# Altium footprint library En.PcbLib: 240 footprints (part 4 of 15)
Each footprint in its own frame and in the unit in brackets; x right, y up, seen from the top. Pads: shape width x height; smd on the part's side, far side on the other; paste and mask are expansions set on the pad; w line width, h text height; cw(c..) or ccw(c..) is an arc to the next point about the centre after c.
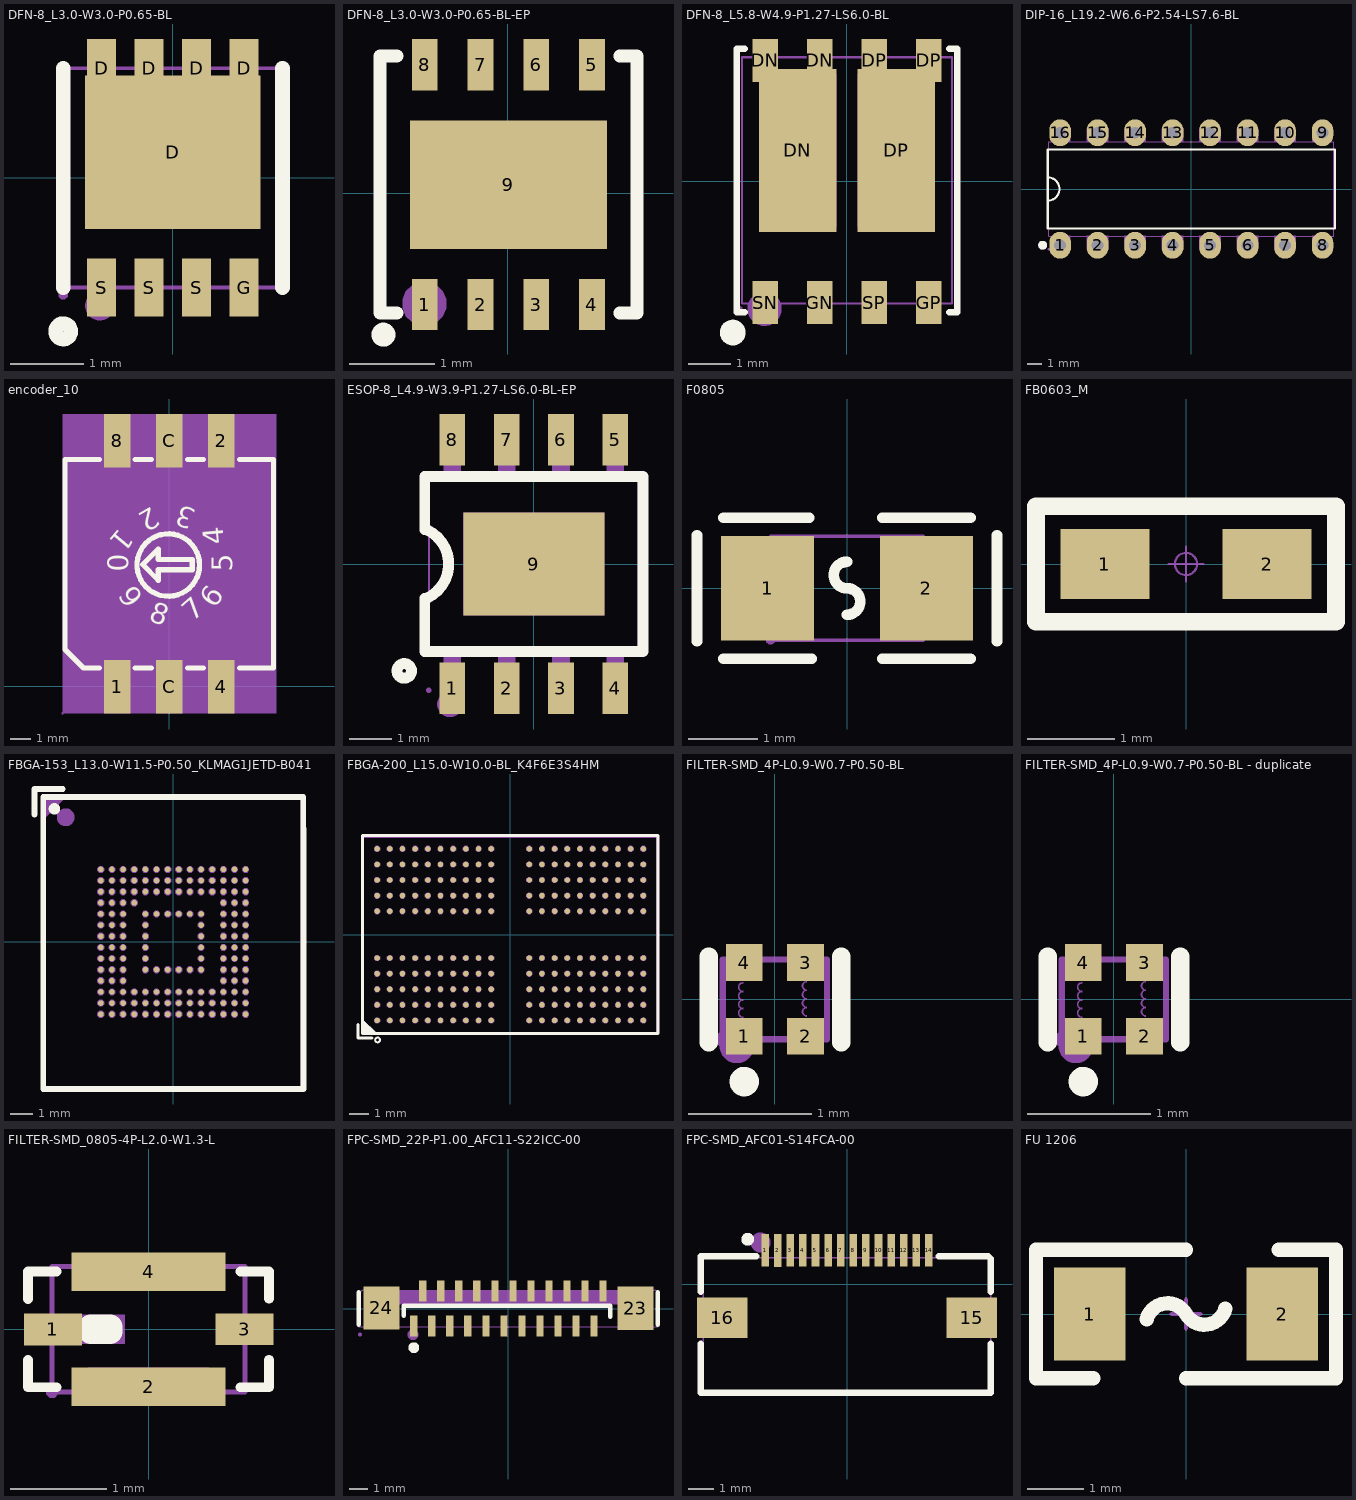
[diagram p3: the footprints below, top view; thin cyan lines are the x and y axes]

## DFN-8_L3.0-W3.0-P0.65-BL [mm]
pads (9):
  rect 0.4x0.8 smd paste-100 mask+0.051: D(-0.975,1.5) D(-0.325,1.5) D(0.325,1.5) D(0.975,1.5) G(0.975,-1.5) S(-0.975,-1.5) S(-0.325,-1.5) S(0.325,-1.5)
  rect 2.4x2.1 smd paste-100 mask+0.051: D(0,0.35)
Top Overlay:
  circle w0.2: c-1.5,-2.1 r0.105
  lines w0.2: -1.5,-1.5 -1.5,1.5 ; 1.5,-1.5 1.5,1.5
Top Paste:
  region: -0.775,-1.9 -1.175,-1.9 -1.175,-1.1 -0.775,-1.1
  region: -0.125,-1.9 -0.525,-1.9 -0.525,-1.1 -0.125,-1.1
  region: 0.525,-1.9 0.125,-1.9 0.125,-1.1 0.525,-1.1
  region: 1.175,-1.9 0.775,-1.9 0.775,-1.1 1.175,-1.1
  region: 1.2,-0.7 -1.2,-0.7 -1.2,1.4 -1.175,1.4 -1.175,1.9 -0.775,1.9 -0.775,1.4 -0.525,1.4 -0.525,1.9 -0.125,1.9 -0.125,1.4 0.125,1.4 0.125,1.9 0.525,1.9 0.525,1.4 0.775,1.4 0.775,1.9 1.175,1.9 1.175,1.4 1.2,1.4
Mechanical 6:
  circle w0.2: c-1,-1.75 r0.1
Mechanical 15:
  region: -1.44,-1.6 -1.44,-1.576 -1.475,-1.541 -1.524,-1.541 -1.559,-1.576 -1.56,-1.6 -1.559,-1.625 -1.524,-1.659 -1.475,-1.659 -1.44,-1.625
  region: 1.125,1.2 0.825,1.2 0.825,1.6 1.125,1.6
  region: 1.125,-1.6 0.825,-1.6 0.825,-1.2 1.125,-1.2
  region: -1.175,1.35 1.175,1.35 1.175,-0.65 -1.175,-0.65
  region: 0.475,-1.6 0.175,-1.6 0.175,-1.2 0.475,-1.2
  region: -0.175,-1.6 -0.475,-1.6 -0.475,-1.2 -0.175,-1.2
  region: -0.825,-1.6 -1.125,-1.6 -1.125,-1.2 -0.825,-1.2
  region: 0.475,1.2 0.175,1.2 0.175,1.6 0.475,1.6
  region: -0.175,1.2 -0.475,1.2 -0.475,1.6 -0.175,1.6
  region: -0.825,1.2 -1.125,1.2 -1.125,1.6 -0.825,1.6
  lines w0.051: -1.5,-1.5 -1.5,1.5 1.5,1.5 1.5,-1.5 -1.5,-1.5
3D body "User Library-DFN_3x3_8L_EP2_P_body.sldprt": height 0.8, standoff 0, extent -1.5,-1.5 1.5,1.5
3D body "User Library-DFN_3x3_8L_EP2_P_lead frame.sldprt": height 0.15, standoff 0, extent -1.55,-1.6 1.55,1.6

## DFN-8_L3.0-W3.0-P0.65-BL-EP [mm]
pads (9):
  rect 0.3x0.6 smd paste+0 mask+0.05: 1(-0.966,-1.297) 2(-0.316,-1.297) 3(0.334,-1.297) 4(0.984,-1.297) 5(0.984,1.503) 6(0.334,1.503) 7(-0.316,1.503) 8(-0.966,1.503)
  rect 2.3x1.5 smd paste+0 mask+0.05: 9(0.009,0.103)
Top Overlay:
  circle w0.178: c-1.449,-1.648 r0.051
  lines w0.15: -1.291,-1.397 -1.491,-1.397 -1.491,1.603 -1.291,1.603 ; 1.309,-1.397 1.509,-1.397 1.509,1.603 1.309,1.603
Mechanical 15:
  region: -1.225,-1.287 -1.225,-1.236 -1.186,-1.143 -1.114,-1.071 -1.021,-1.033 -0.92,-1.033 -0.827,-1.071 -0.755,-1.143 -0.717,-1.236 -0.717,-1.287 -0.717,-1.337 -0.755,-1.431 -0.827,-1.502 -0.92,-1.541 -1.021,-1.541 -1.114,-1.502 -1.186,-1.431 -1.225,-1.337 -1.225,-1.287

## DFN-8_L5.8-W4.9-P1.27-LS6.0-BL [mm]
pads (10):
  rect 0.6x1 smd paste-100 mask+0.05: DN(-1.905,2.825) DN(-0.635,2.825) DP(0.635,2.825) DP(1.905,2.825) GN(-0.635,-2.825) GP(1.905,-2.825) SN(-1.905,-2.825) SP(0.635,-2.825)
  rect 1.8x3.8 smd paste-100 mask+0.05: DN(-1.15,0.725) DP(1.15,0.725)
Top Overlay:
  circle w0.3: c-2.667,-3.526 r0.15
  lines w0.152: -2.382,-3.051 -2.576,-3.051 -2.576,3.101 -2.382,3.101 ; 2.382,-3.051 2.576,-3.051 2.576,3.101 2.382,3.101
Top Paste:
  region: 1.605,2.625 1.605,3.325 2.205,3.325 2.205,2.325 2.05,2.325 2.05,-1.174 2.05,-1.175 0.25,-1.175 0.25,2.625 0.335,2.625 0.335,3.325 0.935,3.325 0.935,2.625
  region: -1.605,2.625 -1.605,3.325 -2.205,3.325 -2.205,2.325 -2.05,2.325 -2.05,-1.174 -2.05,-1.175 -0.25,-1.175 -0.25,2.625 -0.335,2.625 -0.335,3.325 -0.935,3.325 -0.935,2.625
  region: 1.605,-3.325 2.205,-3.325 2.205,-2.325 1.605,-2.325
  region: 0.335,-3.325 0.935,-3.325 0.935,-2.325 0.335,-2.325
  region: -0.935,-3.325 -0.335,-3.325 -0.335,-2.325 -0.935,-2.325
  region: -2.205,-3.325 -1.605,-3.325 -1.605,-2.325 -2.205,-2.325
Mechanical 6:
  circle w0.4: c-1.924,-2.971 r0.2
Mechanical 15:
  region: -2.44,-2.975 -2.44,-2.951 -2.475,-2.916 -2.524,-2.916 -2.559,-2.951 -2.56,-2.975 -2.559,-3 -2.524,-3.034 -2.475,-3.034 -2.44,-3
  region: -2.11,-2.365 -1.7,-2.365 -1.7,-2.975 -2.11,-2.975
  region: -0.84,-2.365 -0.43,-2.365 -0.43,-2.975 -0.84,-2.975
  region: 0.43,-2.365 0.84,-2.365 0.84,-2.975 0.43,-2.975
  region: 1.7,-2.365 2.11,-2.365 2.11,-2.975 1.7,-2.975
  region: 0.25,2.515 1.9,2.515 1.9,-1.065 0.25,-1.065
  region: -1.9,2.515 -0.25,2.515 -0.25,-1.065 -1.9,-1.065
  region: -1.7,2.415 -2.11,2.415 -2.11,3.025 -1.7,3.025
  region: -0.43,2.415 -0.84,2.415 -0.84,3.025 -0.43,3.025
  region: 0.84,2.415 0.43,2.415 0.43,3.025 0.84,3.025
  region: 2.11,2.415 1.7,2.415 1.7,3.025 2.11,3.025
  lines w0.051: -2.45,-2.85 -2.45,2.9 2.45,2.9 2.45,-2.85 -2.45,-2.85
3D body "hn2199.step": height 1.01, standoff -0.01, extent -2.46,-3 2.46,3

## DIP-16_L19.2-W6.6-P2.54-LS7.6-BL [mm]
pads (16):
  oval 1.46x1.825 hole 0.8: 1(-8.89,-3.81) 2(-6.35,-3.81) 3(-3.81,-3.81) 4(-1.27,-3.81) 5(1.27,-3.81) 6(3.81,-3.81) 7(6.35,-3.81) 8(8.89,-3.81) 9(8.89,3.81) 10(6.35,3.81) 11(3.81,3.81) 12(1.27,3.81) 13(-1.27,3.81) 14(-3.81,3.81) 15(-6.35,3.81) 16(-8.89,3.81)
Top Overlay:
  circle w0.3: c-10.072,-3.81 r0.15
  lines w0.152: -9.729,-0.794 ccw(c-9.729,0) -9.729,0.794 ; -9.729,-2.669 9.729,-2.669 9.729,2.669 -9.729,2.669 -9.729,-2.669
Mechanical 6:
  circle w0.3: c-10.072,-3.81 r0.15
Mechanical 15:
  drawing of 37 lines, arcs and shapes, not listed
3D body "xd74ls147.step": height 3.31, standoff -4.05, extent -9.6,-3.833 9.6,4.087

## encoder_10 [mm]
pads (6):
  rect 1.3x2.6 smd: 1(-2.54,-0.025) 2(2.54,11.975) 4(2.54,-0.025) 8(-2.54,11.975) C(0,-0.025) C(0,11.975)
Top Overlay:
  circle w0.254: c-0.05,5.909 r1.524
  lines w0.254: -3.421,0.895 -4.191,0.895 -5.08,1.784 -5.08,11.055 -3.421,11.055 ; -1.659,0.895 -0.881,0.895 ; -1.659,11.055 -0.881,11.055 ; 0.881,0.895 1.659,0.895 ; 0.881,11.055 1.659,11.055 ; 3.421,0.895 5.08,0.895 5.08,11.055 3.421,11.055 ; -1.299,5.931 -0.537,5.169 -0.537,5.296 -0.537,5.677 1.114,5.677 1.114,6.185 -0.537,6.185 -0.537,6.693 -1.299,5.931
  text "0" at -2.008,5.576 h1
  text "4" at 2.674,6.955 h1
  text "8" at -1.044,3.21 h1
  text "9" at -2.545,4.438 h1
  text "1" at -2.418,7.761 h1
  text "2" at -0.865,8.786 h1
  text "3" at 1.365,8.558 h1
  text "5" at 3.072,5.576 h1
  text "6" at 2.207,3.75 h1
  text "7" at 1.133,3.118 h1
Mechanical 4:
  region: -5.207,13.275 5.207,13.275 5.207,-1.325 -5.207,-1.325
Mechanical 5:
  region: -3.19,10.675 -3.19,13.275 -1.89,13.275 -1.89,10.675
  region: -0.65,10.675 -0.65,13.275 0.65,13.275 0.65,10.675
  region: 1.89,10.675 1.89,13.275 3.19,13.275 3.19,10.675
  region: 1.89,-1.325 1.89,1.275 3.19,1.275 3.19,-1.325
  region: -0.65,-1.325 -0.65,1.275 0.65,1.275 0.65,-1.325
  region: -3.19,-1.325 -3.19,1.275 -1.89,1.275 -1.89,-1.325
Mechanical 6:
  circle w0.06: c-5.207,-1.325 r0.03
Mechanical 15:
  lines w0.003: -0.04,6.38 0.01,6.431

## ESOP-8_L4.9-W3.9-P1.27-LS6.0-BL-EP [mm]
pads (9):
  rect 0.6x1.2 smd: 1(-1.905,-2.908) 2(-0.635,-2.908) 3(0.635,-2.908) 4(1.905,-2.908) 5(1.905,2.908) 6(0.635,2.908) 7(-0.635,2.908) 8(-1.905,2.908)
  rect 3.3x2.4 smd: 9(0,0)
Top Overlay:
  circle w0.254: c-3.03,-2.5 r0.17
  lines w0.254: -2.55,-0.8 -2.55,-2.05 2.55,-2.05 2.55,2.05 -2.55,2.05 -2.55,0.8 ; -2.5,-0.8 ccw(c-2.875,0) -2.5,0.8
Mechanical 6:
  circle w0.3: c-1.96,-3.28 r0.15
Mechanical 15:
  region: 1.65,-1.2 -1.65,-1.2 -1.65,1.2 1.65,1.2
  region: 1.705,-2.95 1.705,-2.3 2.105,-2.3 2.105,-2.95
  region: 1.705,-2.31 1.705,-1.94 2.105,-1.94 2.105,-2.31
  region: 0.435,-2.95 0.435,-2.3 0.835,-2.3 0.835,-2.95
  region: 0.435,-2.31 0.435,-1.94 0.835,-1.94 0.835,-2.31
  region: -0.835,-2.95 -0.835,-2.3 -0.435,-2.3 -0.435,-2.95
  region: -0.835,-2.31 -0.835,-1.94 -0.435,-1.94 -0.435,-2.31
  region: -2.105,-2.95 -2.105,-2.3 -1.705,-2.3 -1.705,-2.95
  region: -2.105,-2.31 -2.105,-1.94 -1.705,-1.94 -1.705,-2.31
  region: 1.705,2.3 1.705,2.95 2.105,2.95 2.105,2.3
  region: 1.705,1.94 1.705,2.31 2.105,2.31 2.105,1.94
  region: 0.435,2.3 0.435,2.95 0.835,2.95 0.835,2.3
  region: 0.435,1.94 0.435,2.31 0.835,2.31 0.835,1.94
  region: -0.835,2.3 -0.835,2.95 -0.435,2.95 -0.435,2.3
  region: -0.835,1.94 -0.835,2.31 -0.435,2.31 -0.435,1.94
  region: -2.105,2.3 -2.105,2.95 -1.705,2.95 -1.705,2.3
  region: -2.105,1.94 -2.105,2.31 -1.705,2.31 -1.705,1.94
  region: -2.394,-2.95 -2.395,-2.925 -2.43,-2.891 -2.479,-2.891 -2.514,-2.926 -2.514,-2.95 -2.514,-2.974 -2.479,-3.009 -2.43,-3.009 -2.395,-2.974
  lines w0.051: -2.45,-1.95 -2.45,1.95 2.45,1.95 2.45,-1.95 -2.45,-1.95
3D body "ESOP8.STEP": height 1.53, standoff -0.01, extent -2.5,-3.003 2.5,3.003

## F0805 [mm]
pads (2):
  rect 1.335x1.5 smd paste-100 mask+0.051: 1(-1.142,0) 2(1.142,0)
Top Overlay:
  lines w0.152: -2.159,-0.762 -2.159,0.762 ; -1.778,-1.016 -0.508,-1.016 ; -1.778,1.016 -0.545,1.016 ; 0,-0.381 ccw(c0,-0.191) 0,0 cw(c0,0.191) 0,0.381 ; 0.508,-1.016 1.778,-1.016 ; 0.508,1.016 1.778,1.016 ; 2.159,-0.762 2.159,0.762
Top Paste:
  region: 0.475,-0.62 0.475,-0.2 0.92,-0.2 0.92,0.25 0.48,0.25 0.475,0.66 0.525,0.71 1.675,0.71 1.725,0.66 1.725,-0.62 1.675,-0.67 0.525,-0.67
  region: -1.675,-0.62 -1.675,0.66 -1.625,0.71 -0.475,0.71 -0.425,0.66 -0.42,0.25 -0.87,0.25 -0.87,-0.2 -0.43,-0.2 -0.425,-0.62 -0.475,-0.67 -1.625,-0.67
Mechanical 15:
  region: 1.1,-0.75 0.9,-0.75 0.9,0.75 1.1,0.75
  region: -1.1,0.75 -0.9,0.75 -0.9,-0.75 -1.1,-0.75
  region: -1.04,-0.75 -1.041,-0.726 -1.076,-0.691 -1.125,-0.691 -1.16,-0.726 -1.16,-0.75 -1.16,-0.775 -1.124,-0.809 -1.076,-0.809 -1.041,-0.774
  lines w0.051: -1.1,-0.75 1.1,-0.75 1.1,0.75 -1.1,0.75 -1.1,-0.75
3D body "bsmd0805-010-33v.step": height 0.8, standoff 0, extent -1.05,-0.7 1.05,0.7

## FB0603_M [mil] "0603贴片磁珠"
pads (2):
  rect 40x31.5 smd: 1(-36.5,0) 2(36.5,0)
Top Overlay:
  lines w8: -67.5,-26 -67.5,26 67.5,26 67.5,-26 -67.5,-26
Mechanical 15:
  circle w1: c0,0 r5
  lines w1: -7.87,0 7.87,0 ; 0,-7.87 0,7.87
3D body "742792602.stp": height 31.5, standoff 0, extent -31.5,-15.75 31.5,15.75

## FBGA-153_L13.0-W11.5-P0.50_KLMAG1JETD-B041 [mm]
pads (153):
  round 0.25 smd paste-100 mask+0.05: A1(-3.25,3.25) A2(-2.75,3.25) A3(-2.25,3.25) A4(-1.75,3.25) A5(-1.25,3.25) A6(-0.75,3.25) A7(-0.25,3.25) A8(0.25,3.25) A9(0.75,3.25) A10(1.25,3.25) A11(1.75,3.25) A12(2.25,3.25) A13(2.75,3.25) A14(3.25,3.25) B1(-3.25,2.75) B2(-2.75,2.75) B3(-2.25,2.75) B4(-1.75,2.75) B5(-1.25,2.75) B6(-0.75,2.75) B7(-0.25,2.75) B8(0.25,2.75) B9(0.75,2.75) B10(1.25,2.75) B11(1.75,2.75) B12(2.25,2.75) B13(2.75,2.75) B14(3.25,2.75) C1(-3.25,2.25) C2(-2.75,2.25) C3(-2.25,2.25) C4(-1.75,2.25) C5(-1.25,2.25) C6(-0.75,2.25) C7(-0.25,2.25) C8(0.25,2.25) C9(0.75,2.25) C10(1.25,2.25) C11(1.75,2.25) C12(2.25,2.25) C13(2.75,2.25) C14(3.25,2.25) D1(-3.25,1.75) D2(-2.75,1.75) D3(-2.25,1.75) D4(-1.75,1.75) D12(2.25,1.75) D13(2.75,1.75) D14(3.25,1.75) E1(-3.25,1.25) E2(-2.75,1.25) E3(-2.25,1.25) E5(-1.25,1.25) E6(-0.75,1.25) E7(-0.25,1.25) E8(0.25,1.25) E9(0.75,1.25) E10(1.25,1.25) E12(2.25,1.25) E13(2.75,1.25) E14(3.25,1.25) F1(-3.25,0.75) F2(-2.75,0.75) F3(-2.25,0.75) F5(-1.25,0.75) F10(1.25,0.75) F12(2.25,0.75) F13(2.75,0.75) F14(3.25,0.75) G1(-3.25,0.25) G2(-2.75,0.25) G3(-2.25,0.25) G5(-1.25,0.25) G10(1.25,0.25) G12(2.25,0.25) G13(2.75,0.25) G14(3.25,0.25) H1(-3.25,-0.25) H2(-2.75,-0.25) H3(-2.25,-0.25) H5(-1.25,-0.25) H10(1.25,-0.25) H12(2.25,-0.25) H13(2.75,-0.25) H14(3.25,-0.25) J1(-3.25,-0.75) J2(-2.75,-0.75) J3(-2.25,-0.75) J5(-1.25,-0.75) J10(1.25,-0.75) J12(2.25,-0.75) J13(2.75,-0.75) J14(3.25,-0.75) K1(-3.25,-1.25) K2(-2.75,-1.25) K3(-2.25,-1.25) K5(-1.25,-1.25) K6(-0.75,-1.25) K7(-0.25,-1.25) K8(0.25,-1.25) K9(0.75,-1.25) K10(1.25,-1.25) K12(2.25,-1.25) K13(2.75,-1.25) K14(3.25,-1.25) L1(-3.25,-1.75) L2(-2.75,-1.75) L3(-2.25,-1.75) L12(2.25,-1.75) L13(2.75,-1.75) L14(3.25,-1.75) M1(-3.25,-2.25) M2(-2.75,-2.25) M3(-2.25,-2.25) M4(-1.75,-2.25) M5(-1.25,-2.25) M6(-0.75,-2.25) M7(-0.25,-2.25) M8(0.25,-2.25) M9(0.75,-2.25) M10(1.25,-2.25) M11(1.75,-2.25) M12(2.25,-2.25) M13(2.75,-2.25) M14(3.25,-2.25) N1(-3.25,-2.75) N2(-2.75,-2.75) N3(-2.25,-2.75) N4(-1.75,-2.75) N5(-1.25,-2.75) N6(-0.75,-2.75) N7(-0.25,-2.75) N8(0.25,-2.75) N9(0.75,-2.75) N10(1.25,-2.75) N11(1.75,-2.75) N12(2.25,-2.75) N13(2.75,-2.75) N14(3.25,-2.75) P1(-3.25,-3.25) P2(-2.75,-3.25) P3(-2.25,-3.25) P4(-1.75,-3.25) P5(-1.25,-3.25) P6(-0.75,-3.25) P7(-0.25,-3.25) P8(0.25,-3.25) P9(0.75,-3.25) P10(1.25,-3.25) P11(1.75,-3.25) P12(2.25,-3.25) P13(2.75,-3.25) P14(3.25,-3.25)
Top Overlay:
  circle w0.254: c-5.334,5.969 r0.127
  lines w0.254: -6.223,5.715 -6.223,6.858 -4.953,6.858 ; -5.841,-6.605 5.843,-6.605 5.843,5.079 ; -5.841,-6.5 -5.841,6.5 5.842,6.5 5.842,5.079
Top Paste:
  drawing of 153 lines, arcs and shapes, not listed
Mechanical 6:
  circle w0.4: c-4.826,5.588 r0.2
  region: -4.826,6.477 -5.715,6.477 -5.715,5.588
Mechanical 15:
  drawing of 158 lines, arcs and shapes, not listed
3D body "klmbg2jetd-b041.step": height 1.07, standoff -0.04, extent -5.75,-6.5 5.75,6.5

## FBGA-200_L15.0-W10.0-BL_K4F6E3S4HM [mm]
pads (200):
  round 0.28 smd paste+0 mask+0.05: A1(-6.825,-4.4) A2(-6.825,-3.6) A3(-6.825,-2.8) A4(-6.825,-2) A5(-6.825,-1.2) A8(-6.825,1.2) A9(-6.825,2) A10(-6.825,2.8) A11(-6.825,3.6) A12(-6.825,4.4) AA1(6.175,-4.4) AA2(6.175,-3.6) AA3(6.175,-2.8) AA4(6.175,-2) AA5(6.175,-1.2) AA8(6.175,1.2) AA9(6.175,2) AA10(6.175,2.8) AA11(6.175,3.6) AA12(6.175,4.4) AB1(6.825,-4.4) AB2(6.825,-3.6) AB3(6.825,-2.8) AB4(6.825,-2) AB5(6.825,-1.2) AB8(6.825,1.2) AB9(6.825,2) AB10(6.825,2.8) AB11(6.825,3.6) AB12(6.825,4.4) B1(-6.175,-4.4) B2(-6.175,-3.6) B3(-6.175,-2.8) B4(-6.175,-2) B5(-6.175,-1.2) B8(-6.175,1.2) B9(-6.175,2) B10(-6.175,2.8) B11(-6.175,3.6) B12(-6.175,4.4) C1(-5.525,-4.4) C2(-5.525,-3.6) C3(-5.525,-2.8) C4(-5.525,-2) C5(-5.525,-1.2) C8(-5.525,1.2) C9(-5.525,2) C10(-5.525,2.8) C11(-5.525,3.6) C12(-5.525,4.4) D1(-4.875,-4.4) D2(-4.875,-3.6) D3(-4.875,-2.8) D4(-4.875,-2) D5(-4.875,-1.2) D8(-4.875,1.2) D9(-4.875,2) D10(-4.875,2.8) D11(-4.875,3.6) D12(-4.875,4.4) E1(-4.225,-4.4) E2(-4.225,-3.6) E3(-4.225,-2.8) E4(-4.225,-2) E5(-4.225,-1.2) E8(-4.225,1.2) E9(-4.225,2) E10(-4.225,2.8) E11(-4.225,3.6) E12(-4.225,4.4) F1(-3.575,-4.4) F2(-3.575,-3.6) F3(-3.575,-2.8) F4(-3.575,-2) F5(-3.575,-1.2) F8(-3.575,1.2) F9(-3.575,2) F10(-3.575,2.8) F11(-3.575,3.6) F12(-3.575,4.4) G1(-2.925,-4.4) G2(-2.925,-3.6) G3(-2.925,-2.8) G4(-2.925,-2) G5(-2.925,-1.2) G8(-2.925,1.2) G9(-2.925,2) G10(-2.925,2.8) G11(-2.925,3.6) G12(-2.925,4.4) H1(-2.275,-4.4) H2(-2.275,-3.6) H3(-2.275,-2.8) H4(-2.275,-2) H5(-2.275,-1.2) H8(-2.275,1.2) H9(-2.275,2) H10(-2.275,2.8) H11(-2.275,3.6) H12(-2.275,4.4) J1(-1.625,-4.4) J2(-1.625,-3.6) J3(-1.625,-2.8) J4(-1.625,-2) J5(-1.625,-1.2) J8(-1.625,1.2) J9(-1.625,2) J10(-1.625,2.8) J11(-1.625,3.6) J12(-1.625,4.4) K1(-0.975,-4.4) K2(-0.975,-3.6) K3(-0.975,-2.8) K4(-0.975,-2) K5(-0.975,-1.2) K8(-0.975,1.2) K9(-0.975,2) K10(-0.975,2.8) K11(-0.975,3.6) K12(-0.975,4.4) N1(0.975,-4.4) N2(0.975,-3.6) N3(0.975,-2.8) N4(0.975,-2) N5(0.975,-1.2) N8(0.975,1.2) N9(0.975,2) N10(0.975,2.8) N11(0.975,3.6) N12(0.975,4.4) P1(1.625,-4.4) P2(1.625,-3.6) P3(1.625,-2.8) P4(1.625,-2) P5(1.625,-1.2) P8(1.625,1.2) P9(1.625,2) P10(1.625,2.8) P11(1.625,3.6) P12(1.625,4.4) R1(2.275,-4.4) R2(2.275,-3.6) R3(2.275,-2.8) R4(2.275,-2) R5(2.275,-1.2) R8(2.275,1.2) R9(2.275,2) R10(2.275,2.8) R11(2.275,3.6) R12(2.275,4.4) T1(2.925,-4.4) T2(2.925,-3.6) T3(2.925,-2.8) T4(2.925,-2) T5(2.925,-1.2) T8(2.925,1.2) T9(2.925,2) T10(2.925,2.8) T11(2.925,3.6) T12(2.925,4.4) U1(3.575,-4.4) U2(3.575,-3.6) U3(3.575,-2.8) U4(3.575,-2) U5(3.575,-1.2) U8(3.575,1.2) U9(3.575,2) U10(3.575,2.8) U11(3.575,3.6) U12(3.575,4.4) V1(4.225,-4.4) V2(4.225,-3.6) V3(4.225,-2.8) V4(4.225,-2) V5(4.225,-1.2) V8(4.225,1.2) V9(4.225,2) V10(4.225,2.8) V11(4.225,3.6) V12(4.225,4.4) W1(4.875,-4.4) W2(4.875,-3.6) W3(4.875,-2.8) W4(4.875,-2) W5(4.875,-1.2) W8(4.875,1.2) W9(4.875,2) W10(4.875,2.8) W11(4.875,3.6) W12(4.875,4.4) Y1(5.525,-4.4) Y2(5.525,-3.6) Y3(5.525,-2.8) Y4(5.525,-2) Y5(5.525,-1.2) Y8(5.525,1.2) Y9(5.525,2) Y10(5.525,2.8) Y11(5.525,3.6) Y12(5.525,4.4)
Top Overlay:
  circle w0.1: c-6.8,-5.4 r0.124
  region: -6.8,-5.1 -7.6,-5.1 -7.6,-4.3
  lines w0.152: -7.805,-4.596 -7.805,-5.305 -7.096,-5.305 ; -7.576,-5.076 7.576,-5.076 7.576,5.076 -7.576,5.076 -7.576,-5.076
Mechanical 6:
  region: -6.8,-5.1 -7.6,-5.1 -7.6,-4.3
Mechanical 15:
  drawing of 205 lines, arcs and shapes, not listed
3D body "k4f6e3s4hm-mgcj.step": height 0.89, standoff -0.02, extent -7.5,-5 7.5,5

## FILTER-SMD_4P-L0.9-W0.7-P0.50-BL [mm]
pads (4):
  rect 0.3x0.3 smd paste+0 mask+0.05: 1(-0.25,-0.3) 2(0.25,-0.3) 3(0.25,0.3) 4(-0.25,0.3)
Top Overlay:
  circle w0.12: c-0.25,-0.67 r0.06
  lines w0.15: -0.54,-0.35 -0.54,0.35 ; 0.54,-0.35 0.54,0.35
Mechanical 6:
  drawing of 9 lines, arcs and shapes, not listed
Mechanical 15:
  region: -0.365,-0.325 -0.366,-0.301 -0.401,-0.268 -0.449,-0.268 -0.484,-0.301 -0.485,-0.325 -0.484,-0.349 -0.449,-0.382 -0.401,-0.382 -0.366,-0.349
  region: 0.115,0.325 0.385,0.325 0.385,0.225 0.115,0.225
  region: 0.115,-0.225 0.385,-0.225 0.385,-0.325 0.115,-0.325
  region: -0.385,-0.225 -0.115,-0.225 -0.115,-0.325 -0.385,-0.325
  region: -0.385,0.325 -0.115,0.325 -0.115,0.225 -0.385,0.225
  lines w0.051: -0.425,-0.325 0.425,-0.325 0.425,0.325 -0.425,0.325 -0.425,-0.325
3D body "smm0806e900mst.step": height 0.46, standoff -0.01, extent -0.425,-0.335 0.435,0.335

## FILTER-SMD_4P-L0.9-W0.7-P0.50-BL - duplicate [mm]
pads (4):
  rect 0.3x0.3 smd paste+0 mask+0.05: 1(-0.25,-0.3) 2(0.25,-0.3) 3(0.25,0.3) 4(-0.25,0.3)
Top Overlay:
  circle w0.12: c-0.25,-0.67 r0.06
  lines w0.15: -0.54,-0.35 -0.54,0.35 ; 0.54,-0.35 0.54,0.35
Mechanical 6:
  drawing of 9 lines, arcs and shapes, not listed
Mechanical 15:
  region: -0.365,-0.325 -0.366,-0.301 -0.401,-0.268 -0.449,-0.268 -0.484,-0.301 -0.485,-0.325 -0.484,-0.349 -0.449,-0.382 -0.401,-0.382 -0.366,-0.349
  region: 0.115,0.325 0.385,0.325 0.385,0.225 0.115,0.225
  region: 0.115,-0.225 0.385,-0.225 0.385,-0.325 0.115,-0.325
  region: -0.385,-0.225 -0.115,-0.225 -0.115,-0.325 -0.385,-0.325
  region: -0.385,0.325 -0.115,0.325 -0.115,0.225 -0.385,0.225
  lines w0.051: -0.425,-0.325 0.425,-0.325 0.425,0.325 -0.425,0.325 -0.425,-0.325
3D body "smm0806e900mst.step": height 0.46, standoff -0.01, extent -0.425,-0.335 0.435,0.335

## FILTER-SMD_0805-4P-L2.0-W1.3-L [mm]
pads (4):
  rect 0.6x0.33 smd: 1(-0.994,-0.001) 3(0.994,0)
  rect 1.6x0.4 smd: 2(-0.002,-0.596) 4(-0.002,0.596)
Top Overlay:
  lines w0.102: -1.252,-0.316 -1.252,-0.6 -0.957,-0.6 ; -1.252,0.315 -1.252,0.6 -0.957,0.6 ; 0.953,-0.6 1.248,-0.6 1.248,-0.316 ; 0.953,0.6 1.248,0.6 1.248,0.316
  lines w0.254: -0.601,-0.025 -0.601,0.025 -0.401,0.025 -0.401,-0.025 -0.601,-0.025
Mechanical 6:
  region: -0.7,0.15 -0.25,0.15 -0.25,-0.15 -0.7,-0.15
Mechanical 15:
  region: -0.701,-0.125 -1.001,-0.125 -1.001,0.125 -0.701,0.125
  region: 0.999,-0.126 0.699,-0.126 0.699,0.124 0.999,0.124
  region: -0.627,0.4 -0.627,0.65 0.623,0.65 0.623,0.4
  region: -0.627,-0.65 -0.627,-0.4 0.623,-0.4 0.623,-0.65
  region: -0.941,-0.65 -0.941,-0.625 -0.976,-0.59 -1.026,-0.59 -1.061,-0.625 -1.061,-0.65 -1.061,-0.675 -1.026,-0.71 -0.976,-0.71 -0.941,-0.675
  lines w0.051: -1.001,-0.65 0.999,-0.65 0.999,0.65 -1.001,0.65 -1.001,-0.65
3D body "dea202450bt-1213c1.step": height 0.96, standoff -0.01, extent -1.01,-0.635 1.01,0.635

## FPC-SMD_22P-P1.00_AFC11-S22ICC-00 [mm]
pads (24):
  rect 0.4x1.15 smd: 1(-5.25,-0.975) 2(-4.75,0.975) 3(-4.25,-0.975) 4(-3.75,0.975) 5(-3.25,-0.975) 6(-2.75,0.975) 7(-2.25,-0.975) 8(-1.75,0.975) 9(-1.25,-0.975) 10(-0.75,0.975) 11(-0.25,-0.975) 12(0.25,0.975) 13(0.75,-0.975) 14(1.25,0.975) 15(1.75,-0.975) 16(2.25,0.975) 17(2.75,-0.975) 18(3.25,0.975) 19(3.75,-0.975) 20(4.25,0.975) 21(4.75,-0.975) 22(5.25,0.975)
  rect 2x2.4 smd: 23(7.05,0.02) 24(-7.05,0.03)
Top Overlay:
  lines w0.254: -8.3,-0.904 -8.3,0.905 ; -5.8,-0.4 -5.8,0.15 5.65,0.15 5.65,-0.45 ; 8.3,-0.904 8.3,0.905
  lines w0.3: -5.4,-2.175 ccw(c-5.25,-2.174) -5.1,-2.174 ccw(c-5.25,-2.174) -5.4,-2.172
Mechanical 6:
  circle w0.3: c-5.3,-1.45 r0.15
  region: -6.35,0.2 -6.35,-0.9 -7.9,-0.9 -7.9,0.95 7.85,0.95 7.85,-0.85 6.35,-0.85 6.35,0.25
Mechanical 15:
  region: -6.15,1.03 -6.15,-0.97 -7.95,-0.97 -7.95,1.03
  region: 7.95,1.02 7.95,-0.98 6.15,-0.98 6.15,1.02
  region: -5.35,-0.7 -5.15,-0.7 -5.15,-1.5 -5.35,-1.5
  region: -4.85,1.5 -4.65,1.5 -4.65,0.7 -4.85,0.7
  region: -4.35,-0.7 -4.15,-0.7 -4.15,-1.5 -4.35,-1.5
  region: -3.85,1.5 -3.65,1.5 -3.65,0.7 -3.85,0.7
  region: -3.35,-0.7 -3.15,-0.7 -3.15,-1.5 -3.35,-1.5
  region: -2.85,1.5 -2.65,1.5 -2.65,0.7 -2.85,0.7
  region: -2.35,-0.7 -2.15,-0.7 -2.15,-1.5 -2.35,-1.5
  region: -1.85,1.5 -1.65,1.5 -1.65,0.7 -1.85,0.7
  region: -1.35,-0.7 -1.15,-0.7 -1.15,-1.5 -1.35,-1.5
  region: -0.85,1.5 -0.65,1.5 -0.65,0.7 -0.85,0.7
  region: -0.35,-0.7 -0.15,-0.7 -0.15,-1.5 -0.35,-1.5
  region: 0.15,1.5 0.35,1.5 0.35,0.7 0.15,0.7
  region: 0.65,-0.7 0.85,-0.7 0.85,-1.5 0.65,-1.5
  region: 1.15,1.5 1.35,1.5 1.35,0.7 1.15,0.7
  region: 1.65,-0.7 1.85,-0.7 1.85,-1.5 1.65,-1.5
  region: 2.15,1.5 2.35,1.5 2.35,0.7 2.15,0.7
  region: 2.65,-0.7 2.85,-0.7 2.85,-1.5 2.65,-1.5
  region: 3.15,1.5 3.35,1.5 3.35,0.7 3.15,0.7
  region: 3.65,-0.7 3.85,-0.7 3.85,-1.5 3.65,-1.5
  region: 4.15,1.5 4.35,1.5 4.35,0.7 4.15,0.7
  region: 4.65,-0.7 4.85,-0.7 4.85,-1.5 4.65,-1.5
  region: 5.15,1.5 5.35,1.5 5.35,0.7 5.15,0.7
  region: -8.15,-1.45 -8.15,-1.409 -8.208,-1.35 -8.291,-1.35 -8.35,-1.409 -8.35,-1.45 -8.35,-1.491 -8.291,-1.55 -8.209,-1.55 -8.15,-1.492
  lines w0.051: -8.3,-1.02 8.31,-1.02 8.31,-1.01 8.31,0.78 ccw(c8.07,0.78) 8.07,1.02 8.03,1.02 5.35,1.02 -7.97,1.02 -8,1.02 ccw(c-8,0.72) -8.3,0.72 -8.3,-1.02
3D body "afc11-s22icc-00.step": height 4.4, standoff 0, extent -8.3,-1.5 8.3,1.5

## FPC-SMD_AFC01-S14FCA-00 [mm]
pads (16):
  rect 0.3x1.3 smd: 1(-3.25,1.34) 2(-2.75,1.339) 3(-2.25,1.34) 4(-1.75,1.34) 5(-1.25,1.34) 6(-0.75,1.34) 7(-0.25,1.34) 8(0.25,1.34) 9(0.75,1.34) 10(1.25,1.34) 11(1.75,1.34) 12(2.25,1.34) 13(2.75,1.34) 14(3.25,1.34)
  rect 2x1.6 smd: 15(4.948,-1.34) 16(-4.948,-1.34)
Top Overlay:
  circle w0.254: c-3.937,1.778 r0.127
  lines w0.254: -5.8,-2.371 -5.8,-4.3 5.7,-4.3 5.7,-2.371 ; -5.8,-0.309 -5.8,1.1 -3.6,1.1 ; 3.631,1.1 5.6,1.1 5.7,1 5.7,-0.309
Mechanical 6:
  circle w0.4: c-3.429,1.651 r0.2
Mechanical 15:
  region: 3.15,0.95 3.35,0.95 3.35,1.73 3.15,1.73
  region: 2.65,0.95 2.85,0.95 2.85,1.73 2.65,1.73
  region: 2.15,0.95 2.35,0.95 2.35,1.73 2.15,1.73
  region: 1.65,0.95 1.85,0.95 1.85,1.73 1.65,1.73
  region: 1.15,0.95 1.35,0.95 1.35,1.73 1.15,1.73
  region: 0.65,0.95 0.85,0.95 0.85,1.73 0.65,1.73
  region: 0.15,0.95 0.35,0.95 0.35,1.73 0.15,1.73
  region: -0.35,0.95 -0.15,0.95 -0.15,1.73 -0.35,1.73
  region: -0.85,0.95 -0.65,0.95 -0.65,1.73 -0.85,1.73
  region: -1.35,0.95 -1.15,0.95 -1.15,1.73 -1.35,1.73
  region: -1.85,0.95 -1.65,0.95 -1.65,1.73 -1.85,1.73
  region: -2.35,0.95 -2.15,0.95 -2.15,1.73 -2.35,1.73
  region: -2.85,0.948 -2.65,0.948 -2.65,1.728 -2.85,1.728
  region: -3.35,0.95 -3.15,0.95 -3.15,1.73 -3.35,1.73
  region: 4.196,-0.84 4.196,-1.84 5.696,-1.84 5.696,-0.84
  region: -5.7,-0.84 -5.7,-1.84 -4.2,-1.84 -4.2,-0.84
  region: -5.64,-4.301 -5.641,-4.277 -5.676,-4.242 -5.724,-4.242 -5.759,-4.277 -5.76,-4.301 -5.759,-4.325 -5.724,-4.36 -5.676,-4.36 -5.641,-4.325
  lines w0.051: -5.702,-4.301 5.698,-4.301 5.698,1.049 -5.702,1.049 -5.702,-4.301
3D body "User Library-FPC0_5MM2_0H14P.SLDPRT": height 1.71, standoff -0.39, extent -5.578,-4.49 5.522,1.91

## FU 1206 [mil] "贴片保险丝"
pads (2):
  rect 50x65 smd: 1(-67.5,0) 2(67.5,0)
Top Overlay:
  lines w10: -90,45 0,45 ; -65,-45 -105,-45 -105,45 -65,45 ; -27.48,-3.62 cw(c-12.99,-7.5) 0,0 ccw(c12.99,7.5) 27.48,3.62 ; 0,-45 90,-45 ; 65,-45 105,-45 105,45 65,45
Mechanical 15:
  lines w3: -10,0 10,0 ; 0,-10 0,10
3D body "FU 01206.STEP": height 34.25, standoff 0, extent -62.99,-31.89 62.99,31.89